# Altium integrated library C210 Rev_D.IntLib: 99 symbols (part 1 of 2) (continued)
## ADXL345
designator U?  Manufacturer Part Number 1: ADXL345BCCZ
SENSOR, ACCELEROMETER, 3-AXIS, I2C, SMT, +/-16g, LGA-14 3mmX5mm; Manufacturer 1: Analog Devices; Body Size: 3.0mm x 5.0mm; Current: None; Item Phase: In Production; Use in new designs: Yes; Part Number: ADXL345BCCZ; Manufacturer 2: Analog Devices; Manufacturer Part Number 2: ADXL345BCCZ-RL; Height: 0.45mm; Max Operating Temp: 85; Min Operating Temp: -40; Pins: 14; Revision: 0A; Voltage: N/A; UBX Code: None
footprint ADXL345 (CC-14-1, 14-pin LGA, Analog Devices Accelerometer, .8mm pitch, 3mmX5mm)
pins: 1 VDDIO (power) "Digital Supply Logic Voltage", 2 GND (power) "Ground", 3 RSVD "Connect to Vs or No Connect", 4 GND (power) "Ground", 5 GND (power) "Ground", 6 VS (power) "Supply Voltage", 7 ~{CS} (in) "Logic Low Chip Select for SPI Modes", 8 INT1 (out) "Interrupt 1 Output", 9 INT2 (out) "Interrupt 2 Output", 10 NC "Not Internally Connected", 11 RSVD "Connect to Gnd or No Connect", 12 SDO/ALT ADDR (io) "Serial Data Output/Alternate I2C Address Select.", 13 SDA/SDI/SDIO (io) "Serial Data (I2C)/Serial Data Input (SPI 4-Wire)/Serial Data Input and Output (SPI 3-Wire).", 14 SCL/SCLK (io) "Serial Communications Clock."

## B39162B4353P810
designator FIL?
FILTER, SMT, SAW, GNSS, 1.559-1.606GHz, LGA5; Part Number: B39162B4353P810; Manufacturer 1: RF360; Body Size: 1.4mm x 1.1mm; Current: None; Item Phase: In Production; MFG Package: QCS5P; Use in new designs: Yes; Manufacturer Part Number 1: B39162B4353P810; Supplier 1: Mouser; Supplier Part Number 1: 871-B39162B4353P810; Height: 0.45mm; Max Operating Temp: 85; Min Operating Temp: -40; Part Name: B39162B4353P810; Pins: 5; Revision: 0A; Voltage: N/A; UBX Code: None
footprint QCS5P (UFLGA, 5 pin SAW Filter, .5mm pitch, 1.4mm x 1.1mm)
pins: 1 Input (in) "Filter Input", 2 GND (power) "Ground", 3 GND (power) "Ground", 4 Output (out) "Filter Output", 5 GND (power) "Ground"

## BGA123L4
designator U?
LNA, SMT, GNSS, 1.1-3.6V, 1.1mA18dB, 0.75dB, BGA4; Part Number: BGA123L4; Manufacturer 1: Infineon Technologies; Manufacturer Part Number 1: BGA123L4E6327XTSA1; Body Size: 0.7mm x 0.7mm; Current: None; Item Phase: In Production; MFG Package: TSLP-4-11; Use in new designs: Yes; Supplier 1: Digi-Key; Supplier Part Number 1: BGA123L4E6327XTSA1TR-ND; Height: 0.35mm; Max Operating Temp: 85; Min Operating Temp: -40; Part Name: BGA123L4; Pins: 4; Revision: 0A; Voltage: 1.1-3.6V; UBX Code: None
footprint BGA0.4P2x2-4Pin (UFBGA, 5 pin 2 row x 2 column, .4mm pitch,  0.7mm x 0.7mm)
pins: 1 VCC (power) "DC Supply", 2 AO (out), 3 GND (power) "Ground", 4 AI (in) "LNA Input"

## BLM18EG221SN1
designator FB?  Size: 0603
Ferrite Bead, 220ohm @ 100MHz, 2A, 0603; Part Number: BLM18EG221SN1; Manufacturer 1: Murata Electronics North America; Manufacturer Part Number 1: BLM18EG221SN1D; Part Name: Ferrite Bead 220ohm 2A 0503; Body Size: None; Item Phase: Unreleased; Use in new designs: Yes; Value: None; Supplier 1: Digi-Key; Supplier Part Number 1: 490-3992-2-ND; Current: 2A; Height: 0.8mm; MFG Package: None; Max Operating Temp: 85; Min Operating Temp: -55; Pins: None; Revision: None; Voltage: None; Manufacturer 2: None; Manufacturer Part Number 2: None; Supplier 2: None; Supplier Part Number 2: None; UBX Code: None
footprint BLM18EG221SN1 (Inductor 0603 footprint, IPC high density)
pins: 1, 2

## bq24230
designator U?  (value not drawn)
BAT CHARGER, Li-ION, SMT, USB, PWR PATH, 500mA, 4.4V, 3mmx3mm QFN-16; Manufacturer 1: Texas Instruments; Manufacturer Part Number 1: BQ24230RGTR; Body Size: 3.3mm x 3.3mm; Item Phase: Unreleased; MFG Package: VQFN-16; SMT Pitch: 0.5mm; Use in new designs: Yes; Voltage: 5-6.5V; UBX Code: None; Part Number: bq24230; Supplier 1: Digi-key; Supplier Part Number 1: 296-23937-2-ND; Height: 1mm; Max Operating Temp: 85; Min Operating Temp: -40; Pins: 16; Revision: None; Size: Other; Manufacturer 2: Texas Instruments; Manufacturer Part Number 2: BQ24230RGTT; Supplier 2: None; Supplier Part Number 2: None
footprint QFN0.5P3x3-16Pin_W-Pad (Quad Flat No-Lead, 0.5mm Pitch, 16 Contact, Exposed Pad, 3mmX3mm)
pins: 1 TS (in) "ExternalNTCThermistorInput.Connectthe TS inputto the NTCthermistorin the batterypack.TS monitorsa 10-kΩNTCthermistor.For applicationsthat do not utilizethe TS function,connecta 10-kΩfixedresistorfromTS toVSSto maintaina validvoltagelevelon TS.", 2 BAT (io) "ChargerPowerStageOutputand BatteryVoltageSenseInput.ConnectBATto the positiveterminalof thebattery.BypassBATto VSSwith a 4.7-μF to 47-μF ceramiccapacitor.", 3 BAT (io) "ChargerPowerStageOutputand BatteryVoltageSenseInput.ConnectBATto the positiveterminalof thebattery.BypassBATto VSSwith a 4.7-μF to 47-μF ceramiccapacitor.", 4 CE_N (in) "ChargeEnableActive-LowInput.ConnectCE to a high logiclevelto disablebatterycharging.OUTis activeandbatterysupplementmodeis still available.ConnectCE to a low logiclevelto enablethe batterycharger.CE isinternallypulleddownwith ~285kΩ. Do not leaveCE unconnectedto ensureproperoperation.", 5 EN2 (in) "InputCurrentLimitConfigurationInputs.Use EN1and EN2controlthe maximuminputcurrentand enableUSBcompliance.See Table1 for the descriptionof the operationstates.EN1and EN2are internallypulleddownwith~285kΩ. Do not leaveEN1or EN2unconnectedto ensureproperoperation.", 6 EN1 (in) "InputCurrentLimitConfigurationInputs.Use EN1and EN2controlthe maximuminputcurrentand enableUSBcompliance.See Table1 for the descriptionof the operationstates.EN1and EN2are internallypulleddownwith~285kΩ. Do not leaveEN1or EN2unconnectedto ensureproperoperation.", 7 PGOOD_N (oc) "Open-drainPowerGoodStatusIndicationOutput.PGOODpullsto VSSwhena validinputsourceis detected.PGOODis high-impedancewhenthe inputpoweris not withinspecifiedlimits.ConnectPGOODto the desiredlogicvoltagerail usinga 1-kΩ– 100-kΩresistor,or use with an LEDfor visualindication.", 8 VSS (power) "Ground.Connectto the thermalpad and to the groundrail of the circuit.", 9 CHRG_N (oc) "Open-DrainChargingStatusIndicationOutput.CHGpullsto VSSwhenthe batteryis charging.CHGis highimpedancewhenchargingis completeand whenchargeris disabled.", 10 OUT (out) "SystemSupplyOutput.OUTprovidesa regulatedoutputwhenthe inputis belowthe OVPthresholdand abovethe regulationvoltage.Whenthe inputis out of the operationrange,OUTis connectedto VBAT. ConnectOUTtothe systemload.BypassOUTto VSSwith a 4.7-μF to 47-μF ceramiccapacitor.", 11 OUT (out) "SystemSupplyOutput.OUTprovidesa regulatedoutputwhenthe inputis belowthe OVPthresholdand abovethe regulationvoltage.Whenthe inputis out of the operationrange,OUTis connectedto VBAT. ConnectOUTtothe systemload.BypassOUTto VSSwith a 4.7-μF to 47-μF ceramiccapacitor.", 12 ILIM (in) "AdjustableCurrentLimitProgrammingInput.Connecta 3.1-kΩto 7.8-kΩresistorfromILIMto VSSto programthemaximuminputcurrent(EN2=1,EN1=0).The inputcurrentincludesthe systemload and the batterychargecurrent.LeavingILIMunconnecteddisablesall charging.In USB100/500mode(EN2= 0, EN1=0/1),ILIMcan beleft floating.", 13 IN (in) "InputPowerConnection.ConnectIN to the connectedto externalDC supply(AC adapteror USBport).The inputoperatingrangeis 4.35V to 6.6 V. The inputcan acceptvoltagesup to 26 V withoutdamagebut operationissuspended.Connectbypasscapacitor1μF to 10μF to VSS", 14 TMR (in) "TimerProgrammingInput.TMRcontrolsthe prechargeand fast-chargesafetytimers.ConnectTMRto VSStodisableall safetytimers.Connecta 18-kΩto 72-kΩresistorbetweenTMRand VSSto programthe timersadesiredlength.LeaveTMRunconnectedto set the timersto the 5-hourfast chargeand 30-minuteprechargedefaulttimervalues.", 15 TD (in) "TerminationDsableInput.ConnectTD high to disablechargertermination.ConnectTD to VSSto enablechargertermination.TD is checkedduringstart-uponly and cannotbe changedduringoperation.See the TD sectioninthis datasheetfor a descriptionof the behaviorwhenterminationis disabled.TD is internallypulleddownto VSSwith ~285kΩ. Do not leaveTD unconnectedto ensureproperoperation.", 16 ISET (io) "Fast-ChargeCurrentProgrammingInput.Connecta 1.8-kΩto 36-kΩresistorfromISETto VSSto programthefast-chargecurrentlevel.Chargingis disabledif ISETis left unconnected.Whilecharging,the voltageat ISETreflectsthe actualchargingcurrentand can be usedto monitorchargecurrent.See theChargeCurrentTranslatorsectionfor moredetails.", EPAD (power) "SystemSupplyOutput.OUTprovidesa regulatedoutputwhenthe inputis belowthe OVPthresholdand abovethe regulationvoltage.Whenthe inputis out of the operationrange,OUTis connectedto VBAT. ConnectOUTtothe systemload.BypassOUTto VSSwith a 4.7-μF to 47-μF ceramiccapacitor."

## BQ27421
designator U?
IC, SMT, BATTERY GAUGE, INGLE CELL Li-ION, COULOMB COUNTER, DSBGA-9 1.6mmX1.6mm; Part Number: BQ27421YZFR-G1A; Manufacturer 1: Texas Instruments; Body Size: 1.4mm x 1.1mm; Current: None; Item Phase: In Production; MFG Package: QCS5P; Use in new designs: Yes; Manufacturer Part Number 1: BQ27421YZFR-G1A; Manufacturer 2: Texas Instruments; Manufacturer Part Number 2: BQ27421YZFT-G1A; Height: 0.45mm; Max Operating Temp: 85; Min Operating Temp: -40; Pins: 9; Revision: 0A; Voltage: N/A; UBX Code: None
footprint BQ27421 (9-DSBGA, 9 pin Texas Instruments BQ27421 Battery Gauge, .5mm pitch, 1.6mmX1.6mm)
pins: A1 GPOUT (out) "General Purpose Open Collector Output", A2 SDA (io) "I2C Data Signal", A3 SCL (in) "I2C Clock Signal", B1 BIN (power) "Battery Insertion Detection Input", B2 GND (power) "Ground", B3 VDD (power) "1.8V LDO Output, Decouple with 1uF, Do Not Connect To External Circuit", C1 GND (power) "Ground", C2 SRX "Current Sense Input Connected to VSYS", C3 BAT (power) "LDO Input and Connection To Battery, Decouple with 1uF"

## BQ27520
designator U?
IC, SMT, BATTERY GAUGE, INGLE CELL Li-ION, COULOMB COUNTER, DSBGA-15 2.6mmX2.0mm; Part Number: BQ27520YZFR-G4; Manufacturer 1: Texas Instruments; Part Name: BQ27520-G4; Current: None; Item Phase: In Production; Use in new designs: Yes; Manufacturer Part Number 1: BQ27520YZFR-G4; Manufacturer 2: Texas Instruments; Manufacturer Part Number 2: BQ27520YZFR-G3; Body Size: 2.6mm x 2.0mm; Height: 0.65mm; MFG Package: DSBGA-15; Max Operating Temp: 85; Min Operating Temp: -40; Pins: 15; Revision: 0A; Voltage: N/A; UBX Code: None
footprint BQ27520 (15-DSBGA, 15 pin Texas Instruments BQ27520 Battery Gauge, .5mm pitch, 2.6mmX2.0mm)
pins: A1 SRP "Analog input pin connected to the internal coulomb counter with a Kelvin connection where", A2 SOC_INT (out) "SOC state interrupts output. Open Drain", A3 SCL (in) "I2C Clock Signal", B1 SRN "Analog input pin connected to the internal coulomb counter with a Kelvin connection where", B2 BAT_GD (out) "Battery Good push-pull indicator output. Active low and output disabled by default.", B3 SDA (io) "I2C Data Signal", C1 VSS (power) "Ground", C2 VSS (power) "Ground", C3 BAT_LOW (out) "Battery Low push-pull output indicator. Active high and output enabled by default.", D1 VCC "Regulator output and BQ27520-G4 processor power. Decouple with 1-μF ceramic capacitor", D2 CE (in) "Chip Enable. Internal LDO is disconnected from REGIN when driven low.", D3 TS "Pack thermistor voltage sense (use 103AT-type thermistor). ADC input", E1 REGIN (power) "Regulator input. Decouple with 0.1-μF ceramic capacitor to VSS", E2 BAT "Cell-voltage measurement input. ADC input. Recommend 4.8 V maximum for conversion", E3 BI/TOUT (io) "Battery-insertion detection input. Power pin for pack thermistor network."

## CGGP.25.4.E.02
designator A?  (value not drawn)
ANT, THROUGH-HOLE, PATCH, GNSS, BEIDOU, GLONASS, GPS, 5dBi, 25MMx35MMx4MM; Manufacturer 1: Taoglas; Body Size: 25mm x 25mm; Item Phase: Unreleased; MFG Package: Custom; Use in new designs: Yes; UBX Code: None; Part Number: CGGP.25.4.E.02; Manufacturer Part Number 1: CGGP.25.4.E.02; Supplier 1: Digi-key; Supplier Part Number 1: 931-1472-ND; Height: 4mm; Max Operating Temp: 125; Min Operating Temp: -55; Pins: 1; Revision: None; Size: Other; SMT Pitch: N/A; Voltage: N/A; Manufacturer 2: Molex; Manufacturer Part Number 2: 2042860001; Supplier 2: None; Supplier Part Number 2: None
footprint CGGP.25.4.E.02 (Antenna, Patch, Through Hole, Beidou, Glonass, GPS,  5dBi, 25x25x4mm)
pins: 1 "Feed"

## CON-5Pin_1Row-046284005001846
designator J?
CON FFC/FPC 0.50mm 5Pos R/A, 046284005001846; Part_Type: Connector; Manufacturer 1: KYOCERA AVX; Item_Phase: Preliminary; Component Mounting Type: SMT; Connector Type: FPC; Keyed: No; Pin Pitch: 0.5mm; Rows: 1; Use in new designs: Yes; Voltage: 50V; Manufacturer P/N: 046284005001846; Part Name: CON FFC/FPC 0.50mm 5Pos R/A; Color: White; Height: 1.3mm; Length: 4.05mm; Locking: No; Pins: 5; Width: 4.4mm; Manufacturer Part Number 1: 046284005001846
footprint AVX/Kyocera - 046284005001846 (FPC 0.50mm Pitch, 5Pin, R/A)
pins: 1, 2, 3, 4, 5, MP

## CON-6Pin_2Row_ALT
designator J?, comment Manufacturer P/N: TC2030-IDC-NL  (hidden comment: TC2030-IDC-NLDNP)  (no BOM)
CON PADS FOR CBL PLUG-OF-NAILS 6-PIN NO LEGS; Manufacturer: TAG Connect; Added By: emoo; Part Number: TC2030-IDC-NL; Size: 3.81mm x 7.62mm; Height: 0; DNP: DNP; Added Date: 12/3/2015
footprint TC2030-IDC-NL (CON PADS FOR CBL PLUG-OF-NAILS 6-PIN NO LEGS)
footprint TC2030-IDC-NL No Hole (CON PADS FOR CBL PLUG-OF-NAILS 6-PIN NO LEGS)
pins: 1, 2, 3, 4, 5, 6

## ESD9101P2T5G
designator D?
Diode, TVS, SMT, ESD9101P2T5G, 3.3V, 0.5pF, SOD-923; Manufacturer 1: ON Semiconductor; Part Name: Diode TVS 3.3V SOD-923; Body Size: 0.8mm x 0.6mm; Current: None; Item Phase: In Production; Use in new designs: Yes; Manufacturer Part Number 1: ESD9101P2T5G; Height: 0.4mm; MFG Package: SOD-923; Max Operating Temp: 150; Min Operating Temp: -55; Pins: 2; Revision: 0A; Voltage: 3.3V; UBX Code: None
footprint SOD-923_2 (SOD-923, 2-Leads, Body 1.25x2.50mm, IPC High Density,)
pins: 1, 2

## FDY2000PZ
designator Q?
MOSFET DUAL P-CH 20V SOT-563, -350mA; Part Number: FDY2000PZ; Manufacturer 1: ON Semiconductor; Body Size: 1.6mmx1.6mm; Item Phase: In Production; Transistor Type: Multiple; Thermal Pad: No; Use in new designs: Yes; UBX Code: None; Manufacturer Part Number 1: FDY2000PZ; Supplier 1: Digi-Key; Supplier Part Number 1: 2156-FDY2000PZ-ND; Current: -350mA; Height: 0.6mm; MFG Package: SOT-563; Max Operating Temp: 150; Min Operating Temp: -55; Part Name: MOSFET DUAL P-CH 20V SOT-563; Pins: 6; Revision: 0A; Voltage: 20V; Manufacturer 2: Diodes, Inc.; Manufacturer Part Number 2: DMP2004VK-7; Supplier 2: None; Supplier Part Number 2: None
footprint FDY2000PZ (Mosfet Array 2 P-Channel (Dual) 20V 350mA 446mW Surface Mount SOT-563F)
part A pins: 1 S1, 2 G1, 6 D1
part B pins: 3 D2, 4 S2, 5 G2

## Fiducial_1mm_Circle
designator FD?, comment Fiducial_1mmDNP  (value not drawn)  (no BOM)
1mm Fiducial Target; Added By: EMOO; Part Number: Fiducial_1mm; Height: 0; DNP: DNP; Added Date: 12/12/2020
footprint Fiducial 1mm - Circle (1mm Fiducial Mark)

## FPF2104
designator U?
Load Switch, 400mA, 1.8-5.5V, Active High Enable, SOT-23-5; Manufacturer 1: onsemi; Manufacturer Part Number 1: FPF2104; Current: None; Item Phase: In Production; Use in new designs: Yes; Voltage: 5.5V; Manufacturer 2: None; Manufacturer Part Number 2: None; Supplier 2: None; Supplier Part Number 2: None; Body Size: SOT-23-5; Height: 1.2mm; MFG Package: SOT-23-5; Max Operating Temp: 85; Min Operating Temp: -40; Pins: 5; Revision: 0A; UBX Code: None; Manufacturer P/N: *
footprint SOT-23-5_2 (SOT-23-5, 1.625mm x 2.9mm)
pins: 1 VIN (power) "Supply Input: Input to the power switch and the supply voltage for the I", 2 GND (power) "Ground", 3 ON (in) "ON Control Input", 4 FLAGB (out) "Fault Output: Active LO, open drain output which indicates an over current supply,under voltage or over temperature stat", 5 VOUT (power) "Switch Output: Output of the power switch"

## FT4232H
designator U?
IC, SMT, UART/SERIAL BRIDGE, QUAD, USB 2.0, FULL HANDSHAKE, 12MBps, 2.97-3.63V, 8mmx8mm QFN56; Manufacturer 1: FTDI; Manufacturer Part Number 1: FT4232H; Body Size: 8.0mm x 8.0mm; Item Phase: Unreleased; MFG Package: QFN-56; SMT Pitch: 0.5mm; Use in new designs: Yes; UBX Code: None; Height: 0.9mm; Max Operating Temp: 85; Min Operating Temp: -40; Pins: 56; Revision: None; Size: Other; Voltage: 2.97-3.63V; Manufacturer 2: None; Manufacturer Part Number 2: None; Supplier 2: None; Supplier Part Number 2: None
footprint QFN0.5P8.0x8.0-56Pin_EPAD (QFN 56Pin, 0.5mm pitch, 8.0mm x 8.0mm x 0.5mm, High Density)
pins: 1 EECS (io) "EEPROM – Chip Select. Tri-State during device reset.", 2 VCORE (power) "+1.8V input. Core supply voltage input.", 3 OSCI (in) "Oscillator input", 4 OSCO (out) "Oscillator output", 5 VPHY (power) "+3.3V Input. Internal USB PHY power supply input", 6 REF "Current reference – connect via a 12K Ohm resistor @ 1% to GND", 7 DM (io) "USB port differential data negative. The ESD protection on this pin is ±15kV HBM.", 8 DP (io) "USB port differential data positive. This pin has internal pull-up resistor compliant to the USB", 9 VPLL (power) "+3.3V input. Internal PHY PLL power supply inpuT", 10 TEST (in) "IC test pin – for normal operation should be connected to GND", 11 nRESET (in) "Reset input (active low)", 12 ADBUS0 (io) "TXD, TCK/SK", 13 ADBUS1 (io) "RXD, TDI/DO", 14 ADBUS2 (io) "RTS#, TDO/DI", 15 ADBUS3 (io) "CTS#, TMS/CS", 16 VCCIO (power) "+3.3V input. I/O interface power supply input", 17 ADBUS4 (io) "DTR#, GPIOL0", 18 ADBUS5 (io) "DSR#, GPIOL1", 19 ADBUS6 (io) "DCD#, GPIOL2", 20 ADBUS7 (io) "RI#/TXDEN*, GPIOL3", 21 GND (power) "Power supply common, ground.", 22 BDBUS0 (io) "TXD, TCK/SK", 23 BDBUS1 (io) "RXD, TDI/DO", 24 BDBUS2 (io) "RTS#, TDO/DI", 25 BDBUS3 (io) "CTS#, TMS/CS", 26 BDBUS4 (io) "DTR#, GPIOL0", 27 BDBUS5 (io) "DSR#, GPIOL1", 28 BDBUS6 (io) "DCD#, GPIOL2", 29 BDBUS7 (io) "RI#/TXDEN*, GPIOL3", 30 nSUSPEND (out) "Active low when USB is in suspend mode", 31 VCORE (power) "+1.8V input. Core supply voltage input.", 32 CDBUS0 (io) "TXD", 33 CDBUS1 (io) "RXD", 34 CDBUS2 (io) "RTS#", 35 CDBUS3 (io) "CTS#", 36 VCCIO (power) "+3.3V input. I/O interface power supply input", 37 CDBUS4 (io) "DTR#", 38 CDBUS5 (io) "DSR#", 39 CDBUS6 (io) "DCD#", 40 CDBUS7 (io) "RI#/TXDEN*", 41 GND (power) "Power supply common, ground.", 42 DDBUS0 (io) "TXD", 43 VREGOUT (power) "+1.8V Output. Integrated voltage regulator output. Connect to VCORE", 44 VREGIN (power) "+3.3V Input. Integrated 1.8V voltage regulator input.", 45 GND (power) "Power supply common, ground.", 46 DDBUS1 (io) "RXD", 47 DDBUS2 (io) "RTS#", 48 DDBUS3 (io) "CTS#", 49 DDBUS4 (io) "DTR#", 50 VCCIO (power) "+3.3V input. I/O interface power supply input", 51 DDBUS5 (io) "DSR#", 52 DDBUS6 (io) "DCD#", 53 DDBUS7 (io) "RI#/TXDEN*", 54 nPWREN (out) "Active low power-enable output", 55 EEDATA (io) "EEPROM – Data I/O Connect directly to Data-In", 56 EECLK (out) "Clock signal to EEPROM. Tri-State during device reset", EPAD GND (power) "Power supply common, ground."

## FTSH-105-01-F-DH-A-C - JTAG
designator J?  (value not drawn)
Header 0.05" 10Pin 2Row SMD, RA, Black; Part Name: CON HDR 0.05" 10Pin 2Row RA SMD Black; Part_Type: Connector; Manufacturer 1: Samtec; Item_Phase: Pre-Production; Component Mounting Type: SMT; Keyed: Yes; Locking: No; Pin Pitch: 0.050"; Rows: 2; Part Number: FTSH-105-01-F-DH-A-C - JTAG; Revision: 1; Manufacturer Part Number 1: FTSH-105-01-F-DH-A-C; Supplier 1: Digi-Key; Supplier Part Number 1: SAM13925TR-ND; Color: Black; Connector Type: Header; Height: 3.96mm; Length: 12.75mm; Pins: 10; Use in new designs: Yes; Width: 6.35; Manufacturer 2: Amphenol ICC (FCI); Manufacturer Part Number 2: 20021122-00010T4LF
footprint FTSH-105-01-F-DH-A-C (CONN HEADER SMD R/A 10POS 1.27MM)
pins: 1 VCC, 2 TMS/SWDIO, 3 GND, 4 TCK/SWDCLK, 5 GND, 6 TDO/SWO, 7 KEY, 8 TDI, 9 GND, 10 nRESET

## G85D1160022HHR
designator P?
NANO SIM SOCKET, SWITCH, SMT, HINGED, 13mmX14mm; Part Number: G85D1160022HHR; Manufacturer 1: Amphenol ICC; Current: 1A; Item Phase: In Production; MFG Package: Custom; Use in new designs: Yes; Voltage: 5V; UBX Code: None; Manufacturer Part Number 1: G85D1160022HHR; Body Size: 13mm x 14mm; Height: 1.4mm; Max Operating Temp: 85; Min Operating Temp: -40; Part Name: G85D1160022HHR; Pins: 11; Revision: 0A
footprint G85D1160022HHR (NANO SIM Socket - Switch, 11 Pin, 13mm x 14mm)
pins: C1 VSIM (power) "Input Power Supply", C2 nRESET (in) "Input pull-down", C3 CLK (in) "Pull-down", C5 GND (power) "Ground", C6 VPP/NC (io) "Programming Voltage/Not Used/Input Pull-Up", C7 SIMDATA (io) "Pull-down then pull-up after card activatio", MP SHLDGND (power) "Ground", SW DET "Card Detect (closed to GND when SIM Present)"

## HTU31
designator U?  Manufacturer Part Number 1: HTU31
SENSOR, Humidity, I2C, SMT, DFN-6 2.5mmX2.5mm; Manufacturer 1: TE Connectivity; Part Name: B39162B4353P810; Body Size: 1.4mm x 1.1mm; Current: None; Item Phase: In Production; MFG Package: QCS5P; Use in new designs: Yes; Part Number: HTU31; Height: 0.45mm; Max Operating Temp: 85; Min Operating Temp: -40; Pins: 5; Revision: 0A; Voltage: N/A; UBX Code: None
footprint HTU31 (6-DFN w/ Exposed Pad, 6 pin TE-Connectivity Humidity Sensor, .65mm pitch, 2.5mmX2.5mm)
pins: 1 SDA (io) "I2C Data Signal", 2 GND (power) "Ground", 3 IC_ADDR "Address Selection", 4 ~{RST} (in) "Active Low Reset Input", 5 VDD (power) "Power Supply", 6 SCL (in) "I2C Clock Signal"

## ICG-20330
designator U?  Manufacturer Part Number 1: ICG-20330
SENSOR, Gyroscope, I2C, 3-AXIS, 1.7-3.45V, SMT, LGA-16, 3mmX3mm; Manufacturer 1: TDK InvenSense; Part Name: LIS3MDL; Body Size: 2mm x 2mm; Current: None; Item Phase: In Production; MFG Package: LGA-12; Use in new designs: Yes; Voltage: 1.9-3.6V; Part Number: ICG-20330; Height: 1mm; Max Operating Temp: 85; Min Operating Temp: -40; Pins: 12; Revision: 0A; UBX Code: None
footprint ICG-20330 (LGA 0.5mm Pitch, 3x3, 16 Pin, 3.0mm x 3.0mm)
pins: 1 VDDIO (power) "Digital I/O supply voltage", 2 SCL/SPC (in) "I2C serial clock (SCL); SPI serial clock (SPC)", 3 SDA/SDI (io) "I2C serial data (SDA); SPI serial data input (SDI)", 4 SA0/SDO (io) "I2C slave address LSB (SA0); SPI serial data output (SDO)", 5 ~{CS} (in) "Chip select (0 = SPI mode; 1 = I2C mode)", 6 INT (out) "Interrupt digital output (totem pole or open-drain)", 7 RSVD "Reserved. Do Not Connect.", 8 FSYNC (out) "Synchronization digital input (optional).  Connect to GND if unused.", 9 NC "Connect to GND or do not connect", 10 NC "Connect to GND or do not connect", 11 NC "Connect to GND or do not connect", 12 NC "Connect to GND or do not connect", 13 GND (power) "Connect to GND", 14 REGOUT "Regulator filter capacitor connection", 15 RSVD "Reserved. Connect to GND", 16 VDD (power) "Power Supply"

## LIS3MDL
designator U?  Manufacturer Part Number 1: LIS3MDL
SENSOR, MAGNETOMETER, I2C, 3-AXIS, 1.9-3.6V, SMT, LGA-12, 2mmX2mm; Manufacturer 1: ST Micro; Current: None; Item Phase: In Production; Use in new designs: Yes; Part Number: LIS3MDL; Body Size: 2mm x 2mm; Height: 1mm; MFG Package: LGA-12; Max Operating Temp: 85; Min Operating Temp: -40; Part Name: LIS3MDL; Pins: 12; Revision: 0A; Voltage: 1.9-3.6V; UBX Code: None
footprint LIS3MDL (LGA 0.5mm Pitch, 4x4 w/shared corners, 12 Pin, 2.0mm x 2.0mm)
pins: 1 SCL/SPC (in) "Serial Clock Input", 2 RSVD "Reserved, Connect to Ground", 3 GND (power), 4 C1 "Connect to 100nF capacitor", 5 VDD (power) "Power Supply In", 6 VDD_IO (power) "Power Supply for I/O", 7 INT (out) "Interrupt Output", 8 DRDY (out) "Data Ready Output", 9 SDO/SA1 (io) "SPI serial data output (SDO)I2C less significant bit of the device address (SA1", 10 ~{CS} (in) "Chip Select", 11 SDA/SDI/SDO (io) "Serial Data", 12 RSVD "Reserved, Connect to Ground"

## LTR-303ALS-01
designator U?  Manufacturer Part Number 1: LTR-303ALS-01
SENSOR, AMBIENT LIGHT, I2C, SMT, GNSS, DFN-6 2mmX2mm; Manufacturer 1: Lite-On; Part Name: B39162B4353P810; Body Size: 1.4mm x 1.1mm; Current: None; Item Phase: In Production; MFG Package: QCS5P; Use in new designs: Yes; Part Number: LTR-303ALS-01; Height: 0.45mm; Max Operating Temp: 85; Min Operating Temp: -40; Pins: 5; Revision: 0A; Voltage: N/A; UBX Code: None
footprint LTR-303ALS-01 (6-VFDFN, 6 pin Lite-ON Light Sensor, .65mm pitch, 2mmX2mm)
pins: 1 VDD (power) "Power Supply", 2 NC "No Connection", 3 GND (power) "Ground", 4 SCL (in) "I2C Clock Signal", 5 INT (out) "Open Drain Interrupt Output", 6 SDA (io) "I2C Data Signal"

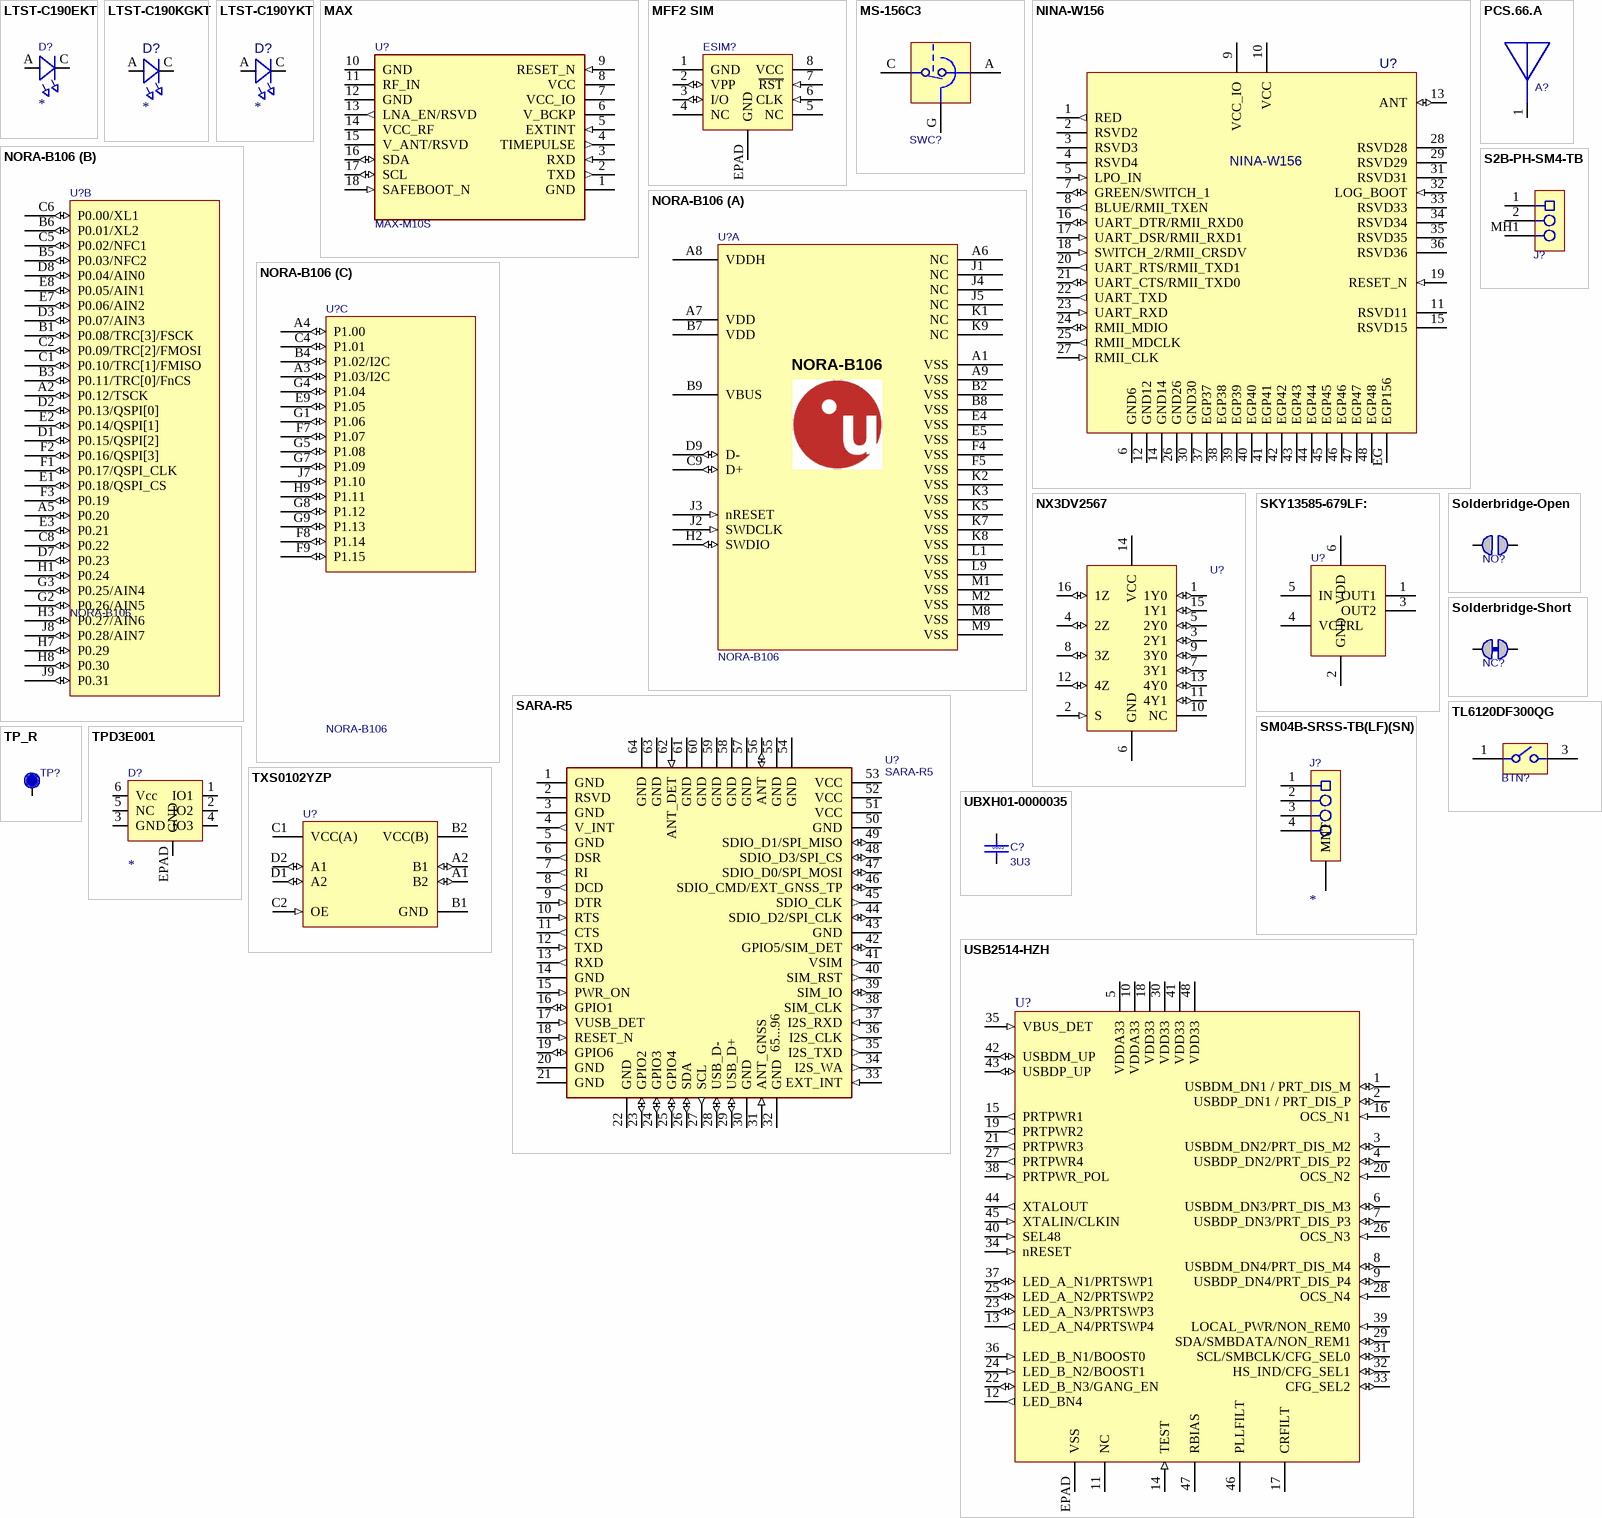
[diagram p2: symbols LTST-C190EKT to USB2514-HZH]

## LTST-C190EKT
designator D?
DIODE, LED, SMT, Red, CLEAR LENS, 2.0V 10mA, 0603; Part Number: LTST-C190EKT; Manufacturer 1: Lite-On Inc; Part Name: LED Red SMT 0603; Body Size: 1.60mm x 0.80mm; Item Phase: In Production; MFG Package: None; Use in new designs: Yes; Manufacturer Part Number 1: LTST-C190EKT; Supplier 1: Digi-Key; Supplier Part Number 1: 160-1182-2-ND; Current: 10mA; Height: 0.80mm; Max Operating Temp: 85; Min Operating Temp: -30; Pins: 2; Revision: 0A; Size: 0603; Voltage: 2.0V; UBX Code: None; Manufacturer 2: None; Manufacturer Part Number 2: None; Supplier 2: None; Supplier Part Number 2: None; Color: *
footprint LTST-C190EKT (Red 621nm LED Indication - Discrete 2V 0603 (1608 Metric))
pins: A Anode, C Cathode

## LTST-C190KGKT
designator D?
DIODE, LED, SMT, GREEN, CLEAR LENS, 2.0V 20mA, 0603; Part Number: 115-00019; Manufacturer 1: Lite-On Inc; Manufacturer Part Number 1: LTST-C190KGKT; Part Name: LED Green SMT 0603; Body Size: 1.60mm x 0.80mm; Item Phase: In Production; MFG Package: None; Use in new designs: Yes; Supplier 1: Digi-Key; Supplier Part Number 1: 160-1435-2-ND; Current: 20mA; Height: 0.80mm; Max Operating Temp: 85; Min Operating Temp: -30; Pins: 2; Revision: 0A; Size: 0603; Voltage: 2.0V; UBX Code: None; Manufacturer 2: None; Manufacturer Part Number 2: None; Supplier 2: None; Supplier Part Number 2: None; Color: *
footprint LTST-C190KGKT (Green 571nm LED Indication - Discrete 2V 0603 (1608 Metric))
pins: A Anode, C Cathode

## LTST-C190YKT
designator D?
DIODE, LED, SMT, YELLOW, CLEAR LENS, 2.1V 10mA, 0603; Part Number: LTST-C190YKT; Manufacturer 1: Lite-On Inc; Part Name: LED Yellow SMT 0603; Body Size: 1.60mm x 0.80mm; Item Phase: In Production; MFG Package: None; Use in new designs: Yes; Manufacturer Part Number 1: LTST-C190YKT; Supplier 1: Digi-Key; Supplier Part Number 1: 160-1184-2-ND; Current: 10mA; Height: 0.80mm; Max Operating Temp: 85; Min Operating Temp: -30; Pins: 2; Revision: 0A; Size: 0603; Voltage: 2.1V; UBX Code: None; Manufacturer 2: None; Manufacturer Part Number 2: None; Supplier 2: None; Supplier Part Number 2: None; Color: *
footprint LTST-C190YKT (Yellow 588nm LED Indication - Discrete 2.1V 0603 (1608 Metric))
pins: A Anode, C Cathode

## MAX
designator U?, comment MAX-M10S
u-blox MAX GNSS module; Part Description: u-blox GNSS module; Manufacturer Part Number 1: MAX-M10S-00B-00; Manufacturer: u-blox; Value: MAX-M10S; Manufacturer 1: u-blox
footprint MAX-M8 (u-blox M8 concurrent GNSS modules)
pins: 1 GND (power) "Ground", 2 TXD (out) "Serial Port", 3 RXD (in) "Serial Port", 4 TIMEPULSE (out) "Time Pulse (1PPS)", 5 EXTINT (in) "External Interrupt Input", 6 V_BCKP (power) "Backup Voltage Supply", 7 VCC_IO (power) "I/O Supply Voltage", 8 VCC (power) "Supply Voltage", 9 RESET_N (in), 10 GND (power) "Ground", 11 RF_IN "GNSS Signal Input", 12 GND (power) "Ground", 13 LNA_EN/RSVD (out) "External LNA/Antenna Supply Output", 14 VCC_RF (power) "Output Voltage RF Section", 15 V_ANT/RSVD, 16 SDA (io) "DDC Serial Data", 17 SCL (io) "DDC Serial Clock", 18 SAFEBOOT_N (in)

## MFF2 SIM
designator ESIM?
ESIM, SMT, MFF2, 1.8V, SMT, VFDFPN8, 5mmX6mm; Part Number: MFF2 SIM; Manufacturer 1: Thingstream; Manufacturer Part Number 1: MFF2 ESIM; Current: None; Item Phase: In Production; Use in new designs: Yes; Body Size: 5mm x 6mm; Height: 1mm; MFG Package: VFDFPN8; Max Operating Temp: 85; Min Operating Temp: -40; Part Name: ESIM; Pins: 12; Revision: 0A; Voltage: 1.8V; UBX Code: None
footprint MFF2 SIM (MFF2 - DFN-8 1.27mm Pitch, 8 Pin w/ EPAD, 5.0mm x 6.0mm)
pins: 1 GND (power) "Ground", 2 VPP (io) "Programming Voltage/Not Used/Input Pull-Up", 3 I/O (io) "Pull-down then pull-up after card activatio", 4 NC "Ground", 5 NC "Ground", 6 CLK (in) "Pull-down", 7 ~{RST} (in) "Input pull-down", 8 VCC (power) "Input Power Supply", EPAD GND "Ground"

## MS-156C3
designator SWC?
Conn, Coax, Test, Switch, 50Ohm, SMT, 2.5mmX2.4mm; Part Number: MS-156C3; Manufacturer 1: Hirose; Part Name: CON HDR 0.1" 3 Pin 1 Row SMT R/A; Item Phase: In Production; Use in new designs: Yes; Voltage: None; Manufacturer Part Number 1: MS-156C3; Supplier 1: None; Supplier Part Number 1: None; Diameter: None; Height: 3.05mm; Max Operating Temp: None; Min Operating Temp: None; Pins: 3; Revision: 0A; UBX Code: None; Manufacturer 2: None; Manufacturer Part Number 2: None; Supplier 2: None; Supplier Part Number 2: None; Manufacturer P/N: *
footprint MS-156C3 (Connector, Coax, Switch, Test, SMT, 2.5mmX2.4mm)
pins: A, C, G

## NINA-W156
designator U?
u-blox NINA-W156 WiFi, Bluetooth dual-mode module; Part Description: Stand-alone Bluetooth low energy module; Manufacturer Part Number 1: NINA-W156-03B-00; Manufacturer: u-blox; Value: NINA-W156; Manufacturer 1: u-blox
footprint NINA_LGA48R_1400X1000X223_PCB (Stand-alone Bluetooth low energy module)
pins: 1 RED (out), 2 RSVD2, 3 RSVD3, 4 RSVD4, 5 LPO_IN (in), 6 GND6 (power), 7 GREEN/SWITCH_1 (io), 8 BLUE/RMII_TXEN (out), 9 VCC_IO (power), 10 VCC (power), 11 RSVD11, 12 GND12 (power), 13 ANT (io), 14 GND14 (power), 15 RSVD15, 16 UART_DTR/RMII_RXD0 (io), 17 UART_DSR/RMII_RXD1 (in), 18 SWITCH_2/RMII_CRSDV (in), 19 RESET_N (in), 20 UART_RTS/RMII_TXD1 (out), 21 UART_CTS/RMII_TXD0 (io), 22 UART_TXD (out), 23 UART_RXD (in), 24 RMII_MDIO (io), 25 RMII_MDCLK (out), 26 GND26 (power), 27 RMII_CLK (in), 28 RSVD28, 29 RSVD29, 30 GND30 (power), 31 RSVD31, 32 LOG_BOOT (in), 33 RSVD33, 34 RSVD34, 35 RSVD35, 36 RSVD36, 37 EGP37 (power), 38 EGP38 (power), 39 EGP39 (power), 40 EGP40 (power), 41 EGP41 (power), 42 EGP42 (power), 43 EGP43 (power), 44 EGP44 (power), 45 EGP45 (power), 46 EGP46 (power), 47 EGP47 (power), 48 EGP48 (power), EG EGP156 (power)

## NORA-B106
designator U?
u-blox NORA-B106 Bluetooth 5.2 LE module - dual core; Manufacturer P/N: NORA-B106-00B; Part Description: Stand-alone Bluetooth low energy module - dual core; Body Size: 14.3 mm x 10.4 mm; Part Number: NORA-B106; Part Name: NORA-B106; Part_Type: Module; Manufacturer: u-blox; Height: 1.8 mm; Value: NORA-B106
footprint NORA_LGA82R_1430X1040X180_ANT (NORA LGA, 82pin ,1.1mm Pitch, 14.3mm x 10.4mm)
footprint NORA_LGA82R_1430X1040X180_ANT - No Paste (NORA LGA, 82pin ,1.1mm Pitch, 14.3mm x 10.4mm)
part A pins: A1 VSS (power), A6 NC (hiz), A7 VDD (power), A8 VDDH (power), A9 VSS (power), B2 VSS (power), B7 VDD (power), B8 VSS (power), B9 VBUS (power), C9 D+ (io), D9 D- (io), E4 VSS (power), E5 VSS (power), F4 VSS (power), F5 VSS (power), H2 SWDIO (io), J1 NC (hiz), J2 SWDCLK (in), J3 nRESET (in), J4 NC (hiz), J5 NC (hiz), K1 NC (hiz), K2 VSS (power), K3 VSS (power), K5 VSS (power), K7 VSS (power), K8 VSS (power), K9 NC (hiz), L1 VSS (power), L9 VSS (power), M1 VSS (power), M2 VSS (power), M8 VSS (power), M9 VSS (power)
part B pins: A2 P0.12/TSCK (io), A5 P0.20 (io), B1 P0.08/TRC[3]/FSCK (io), B3 P0.11/TRC[0]/FnCS (io), B5 P0.03/NFC2 (io), B6 P0.01/XL2 (io), C1 P0.10/TRC[1]/FMISO (io), C2 P0.09/TRC[2]/FMOSI (io), C5 P0.02/NFC1 (io), C6 P0.00/XL1 (io), C8 P0.22 (io), D1 P0.15/QSPI[2] (io), D2 P0.13/QSPI[0] (io), D3 P0.07/AIN3 (io), D7 P0.23 (io), D8 P0.04/AIN0 (io), E1 P0.18/QSPI_CS (io), E2 P0.14/QSPI[1] (io), E3 P0.21 (io), E7 P0.06/AIN2 (io), E8 P0.05/AIN1 (io), F1 P0.17/QSPI_CLK (io), F2 P0.16/QSPI[3] (io), F3 P0.19 (io), G2 P0.26/AIN5 (io), G3 P0.25/AIN4 (io), H1 P0.24 (io), H3 P0.27/AIN6 (io), H7 P0.29 (io), H8 P0.30 (io), J8 P0.28/AIN7 (io), J9 P0.31 (io)
part C pins: A3 P1.03/I2C (io) "I2C Clock SCL", A4 P1.00 (io), B4 P1.02/I2C (io) "I2C Data SDA", C4 P1.01 (io), E9 P1.05 (io), F7 P1.07 (io), F8 P1.14 (io), F9 P1.15 (io), G1 P1.06 (io), G4 P1.04 (io), G5 P1.08 (io), G7 P1.09 (io), G8 P1.12 (io), G9 P1.13 (io), H9 P1.11 (io), J7 P1.10 (io)